# Altium footprint library 7-Connectors-7.PcbLib: 35 footprints (part 2 of 4)
Each footprint in its own frame and in the unit in brackets; x right, y up, seen from the top. Pads: shape width x height; smd on the part's side, far side on the other; paste and mask are expansions set on the pad; w line width, h text height; cw(c..) or ccw(c..) is an arc to the next point about the centre after c.
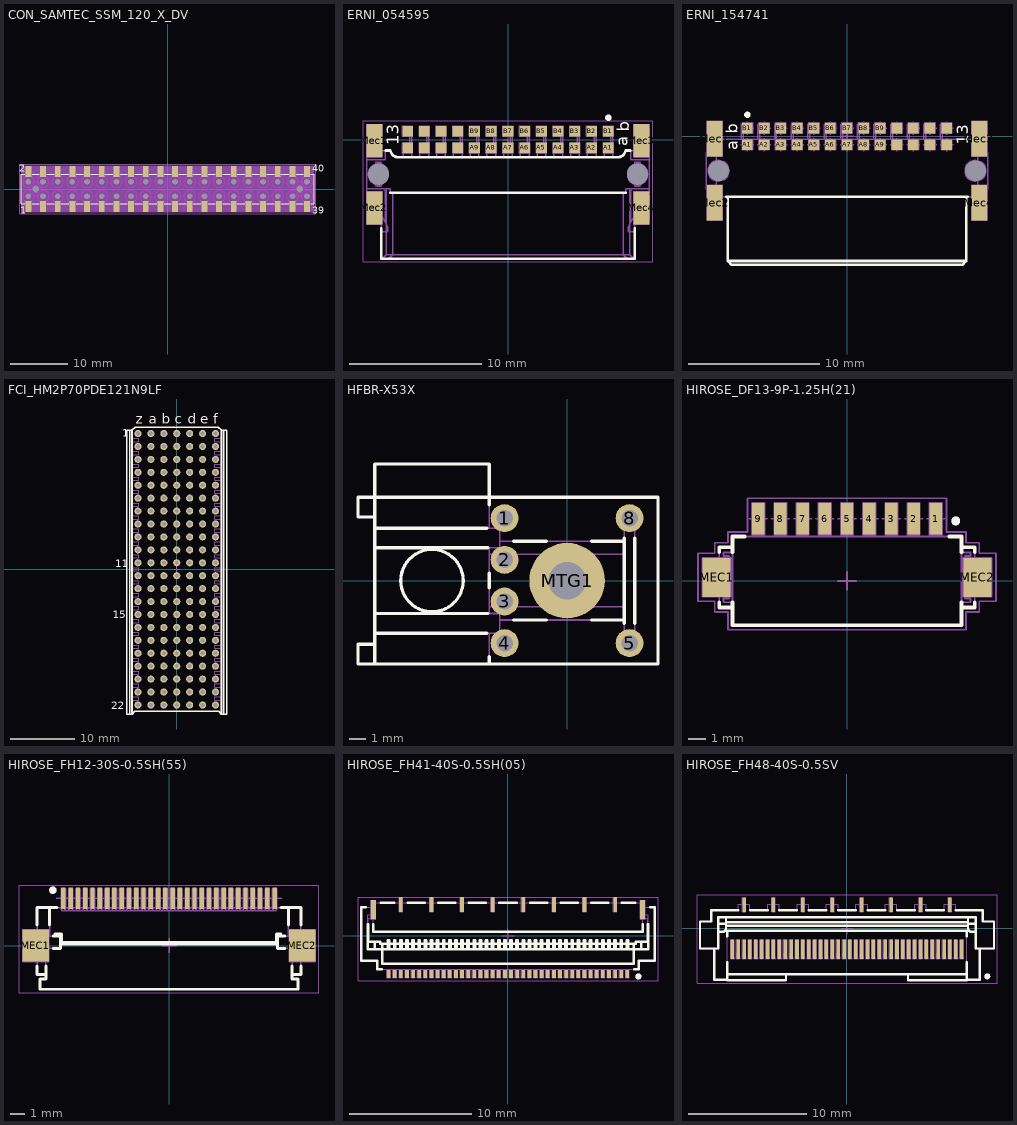
[diagram p1: the footprints below, top view; thin cyan lines are the x and y axes]

## CON_SAMTEC_SSM_120_X_DV [mm] "CON_SAMTEC_SSM_120_X_DV"
height 11
pads (82):
  rect 1.016x1.905 smd: 1(-24.13,-3.048) 2(-24.13,3.048) 3(-21.59,-3.048) 4(-21.59,3.048) 5(-19.05,-3.048) 6(-19.05,3.048) 7(-16.51,-3.048) 8(-16.51,3.048) 9(-13.97,-3.048) 10(-13.97,3.048) 11(-11.43,-3.048) 12(-11.43,3.048) 13(-8.89,-3.048) 14(-8.89,3.048) 15(-6.35,-3.048) 16(-6.35,3.048) 17(-3.81,-3.048) 18(-3.81,3.048) 19(-1.27,-3.048) 20(-1.27,3.048) 21(1.27,-3.048) 22(1.27,3.048) 23(3.81,-3.048) 24(3.81,3.048) 25(6.35,-3.048) 26(6.35,3.048) 27(8.89,-3.048) 28(8.89,3.048) 29(11.43,-3.048) 30(11.43,3.048) 31(13.97,-3.048) 32(13.97,3.048) 33(16.51,-3.048) 34(16.51,3.048) 35(19.05,-3.048) 36(19.05,3.048) 37(21.59,-3.048) 38(21.59,3.048) 39(24.13,-3.048) 40(24.13,3.048)
  round 0.5 / inner round 1 / far side round 0.5 hole 1: " "(-24.13,-1.27) " "(-24.13,1.27) " "(-21.59,-1.27) " "(-21.59,1.27) " "(-19.05,-1.27) " "(-19.05,1.27) " "(-16.51,-1.27) " "(-16.51,1.27) " "(-13.97,-1.27) " "(-13.97,1.27) " "(-11.43,-1.27) " "(-11.43,1.27) " "(-8.89,-1.27) " "(-8.89,1.27) " "(-6.35,-1.27) " "(-6.35,1.27) " "(-3.81,-1.27) " "(-3.81,1.27) " "(-1.27,-1.27) " "(-1.27,1.27) " "(1.27,-1.27) " "(1.27,1.27) " "(3.81,-1.27) " "(3.81,1.27) " "(6.35,-1.27) " "(6.35,1.27) " "(8.89,-1.27) " "(8.89,1.27) " "(11.43,-1.27) " "(11.43,1.27) " "(13.97,-1.27) " "(13.97,1.27) " "(16.51,-1.27) " "(16.51,1.27) " "(19.05,-1.27) " "(19.05,1.27) " "(21.59,-1.27) " "(21.59,1.27) " "(24.13,-1.27) " "(24.13,1.27)
  round 1 / inner round 1.19 / far side round 1 hole 1.19: " "(-22.86,0) " "(22.86,0)
Top Overlay:
  lines w0.18: -24.765,-2.54 -25.4,-2.54 -25.4,2.54 -24.765,2.54 ; -23.495,-2.54 -22.225,-2.54 -22.86,-2.54 ; -23.495,2.54 -22.225,2.54 ; -20.955,-2.54 -19.685,-2.54 ; -20.955,2.54 -19.685,2.54 ; -18.415,-2.54 -17.145,-2.54 ; -18.415,2.54 -17.145,2.54 ; -15.875,-2.54 -14.605,-2.54 ; -15.875,2.54 -14.605,2.54 ; -13.335,-2.54 -12.065,-2.54 ; -13.335,2.54 -12.065,2.54 ; -10.795,-2.54 -9.525,-2.54 ; -10.795,2.54 -9.525,2.54 ; -8.255,-2.54 -6.985,-2.54 ; -8.255,2.54 -6.985,2.54 ; -5.715,-2.54 -4.445,-2.54 ; -5.715,2.54 -4.445,2.54 ; -3.175,-2.54 -1.905,-2.54 ; -3.175,2.54 -1.905,2.54 ; -0.635,-2.54 0.635,-2.54 ; -0.635,2.54 0.635,2.54 ; 1.905,-2.54 3.175,-2.54 ; 1.905,2.54 3.175,2.54 ; 4.445,-2.54 5.715,-2.54 ; 4.445,2.54 5.715,2.54 ; 6.985,-2.54 8.255,-2.54 ; 6.985,2.54 8.255,2.54 ; 9.525,-2.54 10.795,-2.54 ; 9.525,2.54 10.795,2.54 ; 12.065,-2.54 13.335,-2.54 ; 12.065,2.54 13.335,2.54 ; 14.605,-2.54 15.875,-2.54 ; 14.605,2.54 15.875,2.54 ; 17.145,-2.54 18.415,-2.54 ; 17.145,2.54 18.415,2.54 ; 19.685,-2.54 20.955,-2.54 ; 19.685,2.54 20.955,2.54 ; 22.225,-2.54 23.495,-2.54 ; 22.225,2.54 23.495,2.54 ; 24.765,-2.54 25.4,-2.54 25.4,2.54 24.765,2.54
  text "39" at 25,-4.25 h1.2
  text "40" at 25,3 h1.2
  text "2" at -25.75,3 h1.2
  text "1" at -25.5,-4.25 h1.2
Mechanical 6:
  lines w0.18: -24.928,-2.54 -25.4,-2.54 -25.4,2.54 -24.928,2.54 ; -23.332,-2.54 -22.388,-2.54 -22.86,-2.54 ; -23.332,2.54 -22.388,2.54 ; -20.792,-2.54 -19.848,-2.54 ; -20.792,2.54 -19.848,2.54 ; -18.252,-2.54 -17.308,-2.54 ; -18.252,2.54 -17.308,2.54 ; -15.712,-2.54 -14.768,-2.54 ; -15.712,2.54 -14.768,2.54 ; -13.172,-2.54 -12.228,-2.54 ; -13.172,2.54 -12.228,2.54 ; -10.632,-2.54 -9.688,-2.54 ; -10.632,2.54 -9.688,2.54 ; -8.092,-2.54 -7.148,-2.54 ; -8.092,2.54 -7.148,2.54 ; -5.552,-2.54 -4.608,-2.54 ; -5.552,2.54 -4.608,2.54 ; -3.012,-2.54 -2.068,-2.54 ; -3.012,2.54 -2.068,2.54 ; -0.472,-2.54 0.472,-2.54 ; -0.472,2.54 0.472,2.54 ; 2.068,-2.54 3.012,-2.54 ; 2.068,2.54 3.012,2.54 ; 4.608,-2.54 5.552,-2.54 ; 4.608,2.54 5.552,2.54 ; 7.148,-2.54 8.092,-2.54 ; 7.148,2.54 8.092,2.54 ; 9.688,-2.54 10.632,-2.54 ; 9.688,2.54 10.632,2.54 ; 12.228,-2.54 13.172,-2.54 ; 12.228,2.54 13.172,2.54 ; 14.768,-2.54 15.712,-2.54 ; 14.768,2.54 15.712,2.54 ; 17.308,-2.54 18.252,-2.54 ; 17.308,2.54 18.252,2.54 ; 19.848,-2.54 20.792,-2.54 ; 19.848,2.54 20.792,2.54 ; 22.388,-2.54 23.332,-2.54 ; 22.388,2.54 23.332,2.54 ; 24.928,-2.54 25.4,-2.54 25.4,2.54 24.928,2.54
  text "1" at -25.5,-4.25 h1.2
  text "2" at -25.75,3 h1.2
  text "40" at 25,3 h1.2
  text "39" at 25,-4.25 h1.2
Mechanical 16:
  drawing of 219 lines, arcs and shapes, not listed
Multi-Layer keep-out:
  circle w0.025: c-21.59,-1.27 r1.016
  circle w0.025: c-24.13,-1.27 r1.016
  circle w0.025: c-24.13,1.27 r1.016
  circle w0.025: c-21.59,1.27 r1.016
  circle w0.025: c-16.51,-1.27 r1.016
  circle w0.025: c-19.05,-1.27 r1.016
  circle w0.025: c-19.05,1.27 r1.016
  circle w0.025: c-16.51,1.27 r1.016
  circle w0.025: c-13.97,1.27 r1.016
  circle w0.025: c-13.97,-1.27 r1.016
  circle w0.025: c-11.43,-1.27 r1.016
  circle w0.025: c-11.43,1.27 r1.016
  circle w0.025: c-8.89,1.27 r1.016
  circle w0.025: c-6.35,1.27 r1.016
  circle w0.025: c-6.35,-1.27 r1.016
  circle w0.025: c-3.81,-1.27 r1.016
  circle w0.025: c-3.81,1.27 r1.016
  circle w0.025: c3.81,-1.27 r1.016
  circle w0.025: c1.27,-1.27 r1.016
  circle w0.025: c-1.27,-1.27 r1.016
  circle w0.025: c-1.27,1.27 r1.016
  circle w0.025: c1.27,1.27 r1.016
  circle w0.025: c3.81,1.27 r1.016
  circle w0.025: c6.35,1.27 r1.016
  circle w0.025: c6.35,-1.27 r1.016
  circle w0.025: c8.89,-1.27 r1.016
  circle w0.025: c8.89,1.27 r1.016
  circle w0.025: c11.43,1.27 r1.016
  circle w0.025: c11.43,-1.27 r1.016
  circle w0.025: c13.97,-1.27 r1.016
  circle w0.025: c13.97,1.27 r1.016
  circle w0.025: c16.51,1.27 r1.016
  circle w0.025: c16.51,-1.27 r1.016
  circle w0.025: c19.05,-1.27 r1.016
  circle w0.025: c19.05,1.27 r1.016
  circle w0.025: c21.59,1.27 r1.016
  circle w0.025: c21.59,-1.27 r1.016
  circle w0.025: c24.13,-1.27 r1.016
  circle w0.025: c24.13,1.27 r1.016
  circle w0.025: c22.86,0 r1.19
  circle w0.025: c-22.86,0 r1.19
Mechanical 18:
  text "26" at 5.95,3.048 h0.5
  text "25" at 5.95,-3.048 h0.5
  text "27" at 8.49,-3.048 h0.5
  text "30" at 11.03,3.048 h0.5
  text "39" at 23.73,-3.048 h0.5
  text "28" at 8.49,3.048 h0.5
  text "29" at 11.03,-3.048 h0.5
  text "37" at 21.19,-3.048 h0.5
  text "38" at 21.19,3.048 h0.5
  text "31" at 13.57,-3.048 h0.5
  text "32" at 13.57,3.048 h0.5
  text "34" at 16.11,3.048 h0.5
  text "33" at 16.11,-3.048 h0.5
  text "23" at 3.41,-3.048 h0.5
  text "11" at -11.83,-3.048 h0.5
  text "16" at -6.75,3.048 h0.5
  text "24" at 3.41,3.048 h0.5
  text "22" at 0.87,3.048 h0.5
  text "18" at -4.21,3.048 h0.5
  text "13" at -9.29,-3.048 h0.5
  text "17" at -4.21,-3.048 h0.5
  text "21" at 0.87,-3.048 h0.5
  text "15" at -6.75,-3.048 h0.5
  text "20" at -1.67,3.048 h0.5
  text "14" at -9.29,3.048 h0.5
  text "19" at -1.67,-3.048 h0.5
  text "12" at -11.83,3.048 h0.5
  text "10" at -14.37,3.048 h0.5
  text "9" at -14.17,-3.048 h0.5
  text "8" at -16.71,3.048 h0.5
  text "7" at -16.71,-3.048 h0.5
  text "2" at -24.33,3.048 h0.5
  text "4" at -21.79,3.048 h0.5
  text "6" at -19.25,3.048 h0.5
  text "5" at -19.25,-3.048 h0.5
  text "1" at -24.33,-3.048 h0.5
  text "3" at -21.79,-3.048 h0.5
  text "36" at 18.65,3.048 h0.5
  text "35" at 18.65,-3.048 h0.5
  text "40" at 23.73,3.048 h0.5
Mechanical 20:
  text "40" at 22.86,0.635 h1.12
  text "2" at -24.765,0.635 h1.12
  text "39" at 22.86,-1.905 h1.12
  text "1" at -24.765,-1.905 h1.12
  text "PARTNUM" at -5.04,-0.953 h1.8
  text "TOLERANCE" at -6.48,-0.953 h1.8
  text "HDR_2x20_SMT" at -8.64,-0.953 h1.8
Mechanical 24:
  text "PERC: 1mm19 +0.08 -0.00" at -9,-8.04 h0.5
  text "DOC : SAMTEC" at -9,-9.54 h0.5
  text "HGT : 7.40mm" at -9,-8.79 h0.5
  text "PAD : 1mm016x1mm905 tnm1mm19_01 tnm1mm0" at -9,-7.29 h0.5
  text "NAME: CON_SAMTEC_SSM_120_X_DV" at -9,-6.54 h0.5
3D body "p190-100.stp": height 0.02, standoff 0, extent -24.63,-3.998 -23.63,-2.098
3D body "p190-100.stp": height 0.02, standoff 0, extent -24.63,2.098 -23.63,3.998
3D body "p190-100.stp": height 0.02, standoff 0, extent -22.09,-3.998 -21.09,-2.098
3D body "p190-100.stp": height 0.02, standoff 0, extent -22.09,2.098 -21.09,3.998
3D body "p190-100.stp": height 0.02, standoff 0, extent -19.55,-3.998 -18.55,-2.098
3D body "p190-100.stp": height 0.02, standoff 0, extent -19.55,2.098 -18.55,3.998
3D body "p190-100.stp": height 0.02, standoff 0, extent -17.01,-3.998 -16.01,-2.098
3D body "p190-100.stp": height 0.02, standoff 0, extent -17.01,2.098 -16.01,3.998
3D body "p190-100.stp": height 0.02, standoff 0, extent -14.47,-3.998 -13.47,-2.098
3D body "p190-100.stp": height 0.02, standoff 0, extent -14.47,2.098 -13.47,3.998
3D body "p190-100.stp": height 0.02, standoff 0, extent -11.93,-3.998 -10.93,-2.098
3D body "p190-100.stp": height 0.02, standoff 0, extent -11.93,2.098 -10.93,3.998
3D body "p190-100.stp": height 0.02, standoff 0, extent -9.39,-3.998 -8.39,-2.098
3D body "p190-100.stp": height 0.02, standoff 0, extent -9.39,2.098 -8.39,3.998
3D body "p190-100.stp": height 0.02, standoff 0, extent -6.85,-3.998 -5.85,-2.098
3D body "p190-100.stp": height 0.02, standoff 0, extent -6.85,2.098 -5.85,3.998
3D body "p190-100.stp": height 0.02, standoff 0, extent -4.31,-3.998 -3.31,-2.098
3D body "p190-100.stp": height 0.02, standoff 0, extent -4.31,2.098 -3.31,3.998
3D body "p190-100.stp": height 0.02, standoff 0, extent -1.77,-3.998 -0.77,-2.098
3D body "p190-100.stp": height 0.02, standoff 0, extent -1.77,2.098 -0.77,3.998
3D body "p190-100.stp": height 0.02, standoff 0, extent 0.77,-3.998 1.77,-2.098
3D body "p190-100.stp": height 0.02, standoff 0, extent 0.77,2.098 1.77,3.998
3D body "p190-100.stp": height 0.02, standoff 0, extent 3.31,-3.998 4.31,-2.098
3D body "p190-100.stp": height 0.02, standoff 0, extent 3.31,2.098 4.31,3.998
3D body "p190-100.stp": height 0.02, standoff 0, extent 5.85,-3.998 6.85,-2.098
3D body "p190-100.stp": height 0.02, standoff 0, extent 5.85,2.098 6.85,3.998
3D body "p190-100.stp": height 0.02, standoff 0, extent 8.39,-3.998 9.39,-2.098
3D body "p190-100.stp": height 0.02, standoff 0, extent 8.39,2.098 9.39,3.998
3D body "p190-100.stp": height 0.02, standoff 0, extent 10.93,2.098 11.93,3.998
3D body "p190-100.stp": height 0.02, standoff 0, extent 10.93,-3.998 11.93,-2.098
3D body "p190-100.stp": height 0.02, standoff 0, extent 13.47,-3.998 14.47,-2.098
3D body "p190-100.stp": height 0.02, standoff 0, extent 13.47,2.098 14.47,3.998
3D body "p190-100.stp": height 0.02, standoff 0, extent 16.01,-3.998 17.01,-2.098
3D body "p190-100.stp": height 0.02, standoff 0, extent 16.01,2.098 17.01,3.998
3D body "p190-100.stp": height 0.02, standoff 0, extent 18.55,2.098 19.55,3.998
3D body "p190-100.stp": height 0.02, standoff 0, extent 18.55,-3.998 19.55,-2.098
3D body "p190-100.stp": height 0.02, standoff 0, extent 21.09,-3.998 22.09,-2.098
3D body "p190-100.stp": height 0.02, standoff 0, extent 18.55,2.098 19.55,3.998
3D body "p190-100.stp": height 0.02, standoff 0, extent 21.09,2.098 22.09,3.998
3D body "p190-100.stp": height 0.02, standoff 0, extent 23.63,2.098 24.63,3.998
3D body "p190-100.stp": height 0.02, standoff 0, extent 23.63,-3.998 24.63,-2.098

## ERNI_054595 [mil] "26 Contacts Pitch 1.27  SMC Right Angle Male Connector Type B"
height 165.35
pads (32):
  rect 31.5x31.5 smd: A1(300,-25) A2(250,-25) A3(200,-25) A4(150,-25) A5(100,-25) A6(50,-25) A7(0,-25) A8(-50,-25) A9(-100,-25) A10(-150,-25) A11(-200,-25) A12(-250,-25) A13(-300,-25) B1(300,25) B2(250,25) B3(200,25) B4(150,25) B5(100,25) B6(50,25) B7(0,25) B8(-50,25) B9(-100,25) B10(-150,25) B11(-200,25) B12(-250,25) B13(-300,25)
  rect 47.24x98.43 smd: Mec1(-398.82,-3.35) Mec2(-398.82,-204.13) Mec3(398.82,-3.35) Mec4(398.82,-204.13)
  round 39.37 hole 62.99 unplated mask+15.75: Mec5(-387.01,-103.74) Mec6(387.01,-103.74)
Top Overlay:
  circle w9.84: c300,65 r4.92
  lines w7.87: -378.78,-265 -378.78,-355.73 378.78,-355.73 378.78,-265 ; -365,-32.87 -351.22,-32.87 -348.77,-39.6 ccw(c-330.27,-32.87) -330.27,-52.55 330.27,-52.55 ccw(c330.27,-32.87) 348.77,-39.6 351.22,-32.87 365,-32.87 ; -351.61,-158.86 351.61,-158.86
  text "13" at -326.77,-16.73 h35.43
  text "b" at 362.2,22.64 h35.43
  text "a" at 358.27,-20.67 h35.43
Mechanical 8:
  drawing of 188 lines, arcs and shapes, not listed
Mechanical 14:
  drawing of 326 lines, arcs and shapes, not listed
  text "a13" at -330.71,-110.24 h39.37
  text "a1" at 290.55,-110.24 h39.37
  text "13" at -326.77,-16.73 h35.43
  text "a" at 358.27,-20.67 h35.43
  text "b" at 362.2,22.64 h35.43
Mechanical 15:
  lines w1.97: -432.33,-365.58 432.33,-365.58 432.33,55.71 -432.33,55.71 -432.33,-365.58
3D body "p080-080.stp": height 0.79, standoff 0, extent 284.26,9.26 315.76,40.75
3D body "p080-080.stp": height 0.79, standoff 0, extent 284.26,-40.74 315.76,-9.25
3D body "p080-080.stp": height 0.79, standoff 0, extent 234.26,-40.74 265.76,-9.25
3D body "p080-080.stp": height 0.79, standoff 0, extent 234.26,9.26 265.76,40.75
3D body "p080-080.stp": height 0.79, standoff 0, extent 184.26,9.26 215.76,40.75
3D body "p080-080.stp": height 0.79, standoff 0, extent 184.26,-40.74 215.76,-9.25
3D body "p080-080.stp": height 0.79, standoff 0, extent 134.26,-40.74 165.76,-9.25
3D body "p080-080.stp": height 0.79, standoff 0, extent 134.26,9.26 165.76,40.75
3D body "p080-080.stp": height 0.79, standoff 0, extent 84.26,9.26 115.76,40.75
3D body "p080-080.stp": height 0.79, standoff 0, extent 84.26,-40.74 115.76,-9.25
3D body "p080-080.stp": height 0.79, standoff 0, extent 34.26,-40.74 65.76,-9.25
3D body "p080-080.stp": height 0.79, standoff 0, extent 34.26,9.26 65.76,40.75
3D body "p080-080.stp": height 0.79, standoff 0, extent -15.74,9.26 15.76,40.75
3D body "p080-080.stp": height 0.79, standoff 0, extent -15.74,-40.74 15.76,-9.25
3D body "p080-080.stp": height 0.79, standoff 0, extent -65.74,9.26 -34.24,40.75
3D body "p080-080.stp": height 0.79, standoff 0, extent -65.74,-40.74 -34.24,-9.25
3D body "p080-080.stp": height 0.79, standoff 0, extent -115.74,-40.74 -84.24,-9.25
3D body "p080-080.stp": height 0.79, standoff 0, extent -115.74,9.26 -84.24,40.75
3D body "p080-080.stp": height 0.79, standoff 0, extent -165.74,9.26 -134.24,40.75
3D body "p080-080.stp": height 0.79, standoff 0, extent -165.74,-40.74 -134.24,-9.25
3D body "p080-080.stp": height 0.79, standoff 0, extent -215.74,-40.74 -184.24,-9.25
3D body "p080-080.stp": height 0.79, standoff 0, extent -215.74,9.26 -184.24,40.75
3D body "p080-080.stp": height 0.79, standoff 0, extent -265.74,9.26 -234.24,40.75
3D body "p080-080.stp": height 0.79, standoff 0, extent -265.74,-40.74 -234.24,-9.25
3D body "p080-080.stp": height 0.79, standoff 0, extent -315.74,-40.74 -284.24,-9.25
3D body "p080-080.stp": height 0.79, standoff 0, extent -315.74,9.26 -284.24,40.75
3D body "p250-120.stp": height 0.79, standoff 0, extent 375.2,-253.34 422.45,-154.91
3D body "p250-120.stp": height 0.79, standoff 0, extent 375.2,-52.55 422.45,45.87
3D body "p250-120.stp": height 0.79, standoff 0, extent -422.44,-52.55 -375.19,45.87
3D body "p250-120.stp": height 0.79, standoff 0, extent -422.44,-253.34 -375.19,-154.91

## ERNI_154741 [mil] "SMC, 26 Contacts Pitch 1.27, Dual Row Right Angle Female Connectors: Type Q"
height 151.57
pads (32):
  rect 31.5x31.5 smd: A1(-300,-25) A2(-250,-25) A3(-200,-25) A4(-150,-25) A5(-100,-25) A6(-50,-25) A7(0,-25) A8(50,-25) A9(100,-25) A10(150,-25) A11(200,-25) A12(250,-25) A13(300,-25) B1(-300,25) B2(-250,25) B3(-200,25) B4(-150,25) B5(-100,25) B6(-50,25) B7(0,25) B8(50,25) B9(100,25) B10(150,25) B11(200,25) B12(250,25) B13(300,25)
  rect 47.24x106.3 smd: Mec1(-398.82,-7.28) Mec2(-398.82,-200.2) Mec3(398.82,-7.28) Mec4(398.82,-200.2)
  round 39.37 hole 62.99 unplated mask+15.75: Mec5(-387.01,-103.74) Mec6(387.01,-103.74)
Top Overlay:
  circle w9.84: c-300,65 r4.92
  lines w7.87: -363.39,-182.5 363.39,-182.5 ; -359.17,-182.5 -359.17,-375.46 ; 359.17,-182.5 359.17,-375.46 ; -359.17,-375.46 359.17,-375.46 ; -359.17,-375.46 -347.34,-387.2 347.34,-387.2 359.17,-375.46
  text "13" at 365.16,-25.59 h35.43
  text "b" at -328.54,8.27 h35.43
  text "a" at -328.54,-41.73 h35.43
Mechanical 8:
  drawing of 252 lines, arcs and shapes, not listed
Mechanical 14:
  lines w3.94: -420.2,-160.24 -420.2,-245.51 -378.88,-245.51 -378.88,-182.5 378.88,-182.5 378.88,-245.51 420.2,-245.51 420.2,-160.24 ; -420.2,-47.3 -420.2,37.97 -378.88,37.97 -378.88,-21.18 -394.57,-21.18 -394.57,-186.53 -378.88,-186.53 ; -394.57,-166.82 -408.87,-166.82 -424.66,-157.65 -424.66,-49.89 -409.02,-40.81 -394.57,-40.81 ; -378.88,-9.35 378.88,-9.35 ; -359.17,-182.5 -359.17,-375.46 ; -318.28,-9.35 -318.28,36.77 -289.99,36.77 -289.99,13.2 -312.45,13.2 -312.45,-9.35 ; -268.39,-9.35 -268.39,36.77 -240.02,36.77 -240.02,13.2 -262.48,13.2 -262.48,-9.35 ; -218.42,-9.35 -218.42,36.77 -190.13,36.77 -190.13,13.2 -212.5,13.2 -212.5,-9.35 ; -168.44,-9.35 -168.44,36.77 -140.15,36.77 -140.15,13.2 -162.53,13.2 -162.53,-9.35 ; -118.47,-9.35 -118.47,36.77 -90.18,36.77 -90.18,13.2 -112.55,13.2 -112.55,-9.35 ; -68.58,-9.35 -68.58,36.77 -40.2,36.77 -40.2,13.2 -62.66,13.2 -62.66,-9.35 ; -18.52,-9.35 -18.52,36.77 9.77,36.77 9.77,13.2 -12.6,13.2 -12.6,-9.35 ; 31.37,-9.35 31.37,36.77 59.75,36.77 59.75,13.2 37.29,13.2 37.29,-9.35 ; 81.35,-9.35 81.35,36.77 109.72,36.77 109.72,13.2 87.26,13.2 87.26,-9.35 ; 131.32,-9.35 131.32,36.77 159.61,36.77 159.61,13.2 137.24,13.2 137.24,-9.35 ; 181.3,-9.35 181.3,36.77 209.59,36.77 209.59,13.2 187.21,13.2 187.21,-9.35 ; 231.27,-9.35 231.27,36.77 259.56,36.77 259.56,13.2 237.1,13.2 237.1,-9.35 ; 281.25,-9.35 281.25,36.77 309.54,36.77 309.54,13.2 287.16,13.2 287.16,-9.35 ; 359.17,-182.5 359.17,-375.46 ; 378.88,-186.53 394.57,-186.53 394.57,-21.18 378.88,-21.18 ; 392.69,-21.18 378.88,-21.18 ; 394.57,-166.82 408.87,-166.82 424.66,-157.65 424.66,-49.89 409.02,-40.81 394.57,-40.81 ; 420.2,-47.3 420.2,37.97 378.88,37.97 378.88,-21.18 ; -359.17,-375.46 359.17,-375.46 ; -359.17,-375.46 -347.34,-387.2 347.34,-387.2 359.17,-375.46
  text "a1" at -319.37,-98.19 h35.43
  text "a13" at 246.06,-98.66 h39.37
  text "a" at -328.54,-41.73 h35.43
  text "b" at -328.54,8.27 h35.43
3D body "ERNI_154741.stp": height 151.57, standoff -29.53, extent -425,-387.2 425,38
3D body "p080-080.stp": height 0.79, standoff 0, extent -315.75,9.25 -284.25,40.75
3D body "p080-080.stp": height 0.79, standoff 0, extent -315.75,-40.75 -284.25,-9.25
3D body "p080-080.stp": height 0.79, standoff 0, extent -265.75,9.25 -234.25,40.75
3D body "p080-080.stp": height 0.79, standoff 0, extent -265.75,-40.75 -234.25,-9.25
3D body "p080-080.stp": height 0.79, standoff 0, extent -215.75,9.25 -184.25,40.75
3D body "p080-080.stp": height 0.79, standoff 0, extent -215.75,-40.75 -184.25,-9.25
3D body "p080-080.stp": height 0.79, standoff 0, extent -165.75,9.25 -134.25,40.75
3D body "p080-080.stp": height 0.79, standoff 0, extent -165.75,-40.75 -134.25,-9.25
3D body "p080-080.stp": height 0.79, standoff 0, extent -115.75,9.25 -84.25,40.75
3D body "p080-080.stp": height 0.79, standoff 0, extent -115.75,-40.75 -84.25,-9.25
3D body "p080-080.stp": height 0.79, standoff 0, extent -65.75,9.25 -34.25,40.75
3D body "p080-080.stp": height 0.79, standoff 0, extent -65.75,-40.75 -34.25,-9.25
3D body "p080-080.stp": height 0.79, standoff 0, extent -15.75,9.25 15.75,40.75
3D body "p080-080.stp": height 0.79, standoff 0, extent -15.75,-40.75 15.75,-9.25
3D body "p080-080.stp": height 0.79, standoff 0, extent 34.25,9.25 65.75,40.75
3D body "p080-080.stp": height 0.79, standoff 0, extent 34.25,-40.75 65.75,-9.25
3D body "p080-080.stp": height 0.79, standoff 0, extent 84.25,9.25 115.75,40.75
3D body "p080-080.stp": height 0.79, standoff 0, extent 84.25,-40.75 115.75,-9.25
3D body "p080-080.stp": height 0.79, standoff 0, extent 134.25,-40.75 165.75,-9.25
3D body "p080-080.stp": height 0.79, standoff 0, extent 134.25,9.25 165.75,40.75
3D body "p080-080.stp": height 0.79, standoff 0, extent 184.25,9.25 215.75,40.75
3D body "p080-080.stp": height 0.79, standoff 0, extent 184.25,-40.75 215.75,-9.25
3D body "p080-080.stp": height 0.79, standoff 0, extent 234.25,9.25 265.75,40.75
3D body "p080-080.stp": height 0.79, standoff 0, extent 234.25,-40.75 265.75,-9.25
3D body "p080-080.stp": height 0.79, standoff 0, extent 284.25,9.25 315.75,40.75
3D body "p080-080.stp": height 0.79, standoff 0, extent 284.25,-40.75 315.75,-9.25
3D body "p300-140.stp": height 0.79, standoff 0, extent -427.56,-64.06 -372.44,54.05
3D body "p300-140.stp": height 0.79, standoff 0, extent -427.56,-264.06 -372.44,-145.95
3D body "p300-140.stp": height 0.79, standoff 0, extent 372.44,-69.06 427.56,49.05
3D body "p300-140.stp": height 0.79, standoff 0, extent 372.44,-264.06 427.56,-145.95

## FCI_HM2P70PDE121N9LF [mm] "110+44 Contacts, 22 positions x 5 Rows  (a,b,c,d,e) + 2  Rows (z,f), Pitch 2 mm,  Press-Fit, Straight Hard Metric Male Connector, Millipacs, Type B22"
height 13.6
pads (154):
  round 1.1 hole 0.6: a1(-4,21) a2(-4,19) a3(-4,17) a4(-4,15) a5(-4,13) a6(-4,11) a7(-4,9) a8(-4,7) a9(-4,5) a10(-4,3) a11(-4,1) a12(-4,-1) a13(-4,-3) a14(-4,-5) a15(-4,-7) a16(-4,-9) a17(-4,-11) a18(-4,-13) a19(-4,-15) a20(-4,-17) a21(-4,-19) a22(-4,-21) b1(-2,21) b2(-2,19) b3(-2,17) b4(-2,15) b5(-2,13) b6(-2,11) b7(-2,9) b8(-2,7) b9(-2,5) b10(-2,3) b11(-2,1) b12(-2,-1) b13(-2,-3) b14(-2,-5) b15(-2,-7) b16(-2,-9) b17(-2,-11) b18(-2,-13) b19(-2,-15) b20(-2,-17) b21(-2,-19) b22(-2,-21) c1(0,21) c2(0,19) c3(0,17) c4(0,15) c5(0,13) c6(0,11) c7(0,9) c8(0,7) c9(0,5) c10(0,3) c11(0,1) c12(0,-1) c13(0,-3) c14(0,-5) c15(0,-7) c16(0,-9) c17(0,-11) c18(0,-13) c19(0,-15) c20(0,-17) c21(0,-19) c22(0,-21) d1(2,21) d2(2,19) d3(2,17) d4(2,15) d5(2,13) d6(2,11) d7(2,9) d8(2,7) d9(2,5) d10(2,3) d11(2,1) d12(2,-1) d13(2,-3) d14(2,-5) d15(2,-7) d16(2,-9) d17(2,-11) d18(2,-13) d19(2,-15) d20(2,-17) d21(2,-19) d22(2,-21) e1(4,21) e2(4,19) e3(4,17) e4(4,15) e5(4,13) e6(4,11) e7(4,9) e8(4,7) e9(4,5) e10(4,3) e11(4,1) e12(4,-1) e13(4,-3) e14(4,-5) e15(4,-7) e16(4,-9) e17(4,-11) e18(4,-13) e19(4,-15) e20(4,-17) e21(4,-19) e22(4,-21) f1(6,21) f2(6,19) f3(6,17) f4(6,15) f5(6,13) f6(6,11) f7(6,9) f8(6,7) f9(6,5) f10(6,3) f11(6,1) f12(6,-0.998) f13(6,-3) f14(6,-4.998) f15(6,-7) f16(6,-9) f17(6,-11) f18(6,-13) f19(6,-15) f20(6,-17) f21(6,-19) f22(6,-21) z1(-6,21) z2(-6,19) z3(-6,17) z4(-6,15) z5(-6,13) z6(-6,11) z7(-6,9) z8(-6,7) z9(-6,5) z10(-6,3) z11(-6,1) z12(-6,-1) z13(-6,-3) z14(-6,-5) z15(-6,-7) z16(-6,-9) z17(-6,-11) z18(-6,-13) z19(-6,-15) z20(-6,-17) z21(-6,-19) z22(-6,-21)
Top Overlay:
  lines w0.2: -7.25,-22.4 -7.25,21.5 ; -6.95,-22.4 -6.95,21.5 ; -6.9,21.55 -6.9,-22.4 ; 6.9,21.55 6.9,-22.4 ; 6.95,-22.4 6.95,21.5 ; 7.25,-22.4 7.25,21.5 ; -6.95,21.5 -7.7,21.5 -7.7,-22.4 -6.9,-22.4 ; -6.95,21.5 -6.45,22 6.45,22 6.95,21.5 ; -6.9,-22.4 -6.5,-22 6.5,-22 6.9,-22.4 ; 6.9,-22.4 7.7,-22.4 7.7,21.5 6.95,21.5
  text "15" at -9.925,-7.558 h1.2
  text "22" at -10.1,-21.661 h1.2
  text "1" at -8.45,20.475 h1.2
  text "11" at -9.525,0.342 h1.2
  text "z" at -6.363,22.525 h1.5
  text "f" at 5.637,22.5 h1.5
  text "e" at 3.667,22.517 h1.5
  text "d" at 1.667,22.5 h1.5
  text "c" at -0.333,22.517 h1.5
  text "b" at -2.333,22.5 h1.5
  text "a" at -4.333,22.517 h1.5
Mechanical 8:
  drawing of 620 lines, arcs and shapes, not listed
Mechanical 14:
  drawing of 760 lines, arcs and shapes, not listed
  text "15" at -9.925,-7.558 h1.2
  text "22" at -10.1,-21.661 h1.2
  text "11" at -9.525,0.342 h1.2
  text "1" at -8.45,20.475 h1.2
  text "z" at -6.363,22.525 h1.5
  text "f" at 5.637,22.5 h1.5
  text "e" at 3.667,22.517 h1.5
  text "d" at 1.667,22.5 h1.5
  text "c" at -0.333,22.517 h1.5
  text "b" at -2.333,22.5 h1.5
  text "a" at -4.333,22.517 h1.5
Drill Drawing:
  lines w0.1: -6.9,-18.7 -6.9,-22 6.9,-22 6.9,22 -6.9,22 -6.9,19.7
  text "PRESS-FIT TECHNOLOGY diam. 0.6mm +0.05 -0" at -7.2,-17.775 h1
3D body "FCI_HM2P70PDE121N9LF.stp": height 13.45, standoff -3.3, extent -7.7,-22.4 7.7,22

## HFBR-X53X [mm] "HFBR-0500Z Series, Vertical Package Fiber Optic Transmitter or Receiver, Through Hole Mount"
height 18.8
pads (7):
  round 1.7 hole 1: 1(-3.81,3.81) 2(-3.81,1.27) 3(-3.81,-1.27) 4(-3.81,-3.81) 5(3.81,-3.81) 8(3.81,3.81)
  round 4.6 hole 2.3: MTG1(0,0)
Top Overlay:
  circle w0.2: c-8.24,0 r1.9
  lines w0.2: -11.73,-3.88 -12.75,-3.88 -12.75,-5.08 -11.73,-5.08 ; -11.73,-3.2 -4.901,-3.2 ; -11.73,-2 -4.825,-2 ; -11.73,2 -4.825,2 ; -11.73,3.2 -4.901,3.2 ; -11.73,3.88 -12.75,3.88 -12.75,5.08 5.54,5.08 5.54,-5.08 -11.73,-5.08 ; -4.75,-5.08 -4.75,-4.634 ; -4.75,-0.446 -4.75,0.446 ; -4.75,4.634 -4.75,7.11 -11.73,7.11 -11.73,-5.08 ; -3.276,-2.4 -1.27,-2.4 ; -3.276,2.4 -1.27,2.4 ; 1.484,-2.4 3.49,-2.4 ; 1.484,2.4 3.49,2.4 ; 3.49,-2.602 3.49,2.602 ; 4.13,-2.602 4.13,2.602
Mechanical 8:
  lines w0.1: -4.31,-3.81 -3.81,-3.81 ; -4.31,-1.27 -3.81,-1.27 ; -4.31,1.27 -3.81,1.27 ; -4.31,3.81 -3.81,3.81 ; -3.81,-4.31 -3.81,-3.81 ; -3.81,-3.31 -3.81,-3.81 ; -3.81,-1.77 -3.81,-1.27 ; -3.81,-0.77 -3.81,-1.27 ; -3.81,0.77 -3.81,1.27 ; -3.81,1.77 -3.81,1.27 ; -3.81,3.31 -3.81,3.81 ; -3.81,4.31 -3.81,3.81 ; -3.31,-3.81 -3.81,-3.81 ; -3.31,-1.27 -3.81,-1.27 ; -3.31,1.27 -3.81,1.27 ; -3.31,3.81 -3.81,3.81 ; -0.5,0 0,0 ; 0,-0.5 0,0 ; 0,0.5 0,0 ; 0.5,0 0,0 ; 3.31,-3.81 3.81,-3.81 ; 3.31,3.81 3.81,3.81 ; 3.81,-4.31 3.81,-3.81 ; 3.81,-3.31 3.81,-3.81 ; 3.81,3.31 3.81,3.81 ; 3.81,4.31 3.81,3.81 ; 4.31,-3.81 3.81,-3.81 ; 4.31,3.81 3.81,3.81
Mechanical 14:
  circle w0.1: c-8.24,0 r1.9
  lines w0.1: -11.73,-3.88 -12.75,-3.88 -12.75,-5.08 -11.73,-5.08 ; -11.73,-3.2 -4.11,-3.2 -4.11,-2 -11.73,-2 ; -11.73,2 -4.11,2 -4.11,3.2 -11.73,3.2 ; -11.73,3.88 -12.75,3.88 -12.75,5.08 5.54,5.08 5.54,-5.08 -11.73,-5.08 ; -4.75,-5.08 -4.75,-3.2 ; -4.75,-2 -4.75,2 ; -4.75,-1.6 3.49,-1.6 ; -4.75,1.6 3.49,1.6 ; -4.75,3.2 -4.75,7.11 -11.73,7.11 -11.73,-5.08 ; -4.11,-2.4 3.49,-2.4 ; -4.11,2.4 3.49,2.4 ; 3.11,3.81 cw(c3.81,3.81) 4.51,3.81 ; 3.49,-3.81 ccw(c3.81,-3.81) 4.13,-3.81 4.13,3.81 ccw(c3.81,3.81) 3.49,3.81 3.49,-3.81
3D body "HFBR-x53x.stp": height 18.8, standoff -4, extent -12.75,-5.08 5.54,7.11

## HIROSE_DF13-9P-1.25H(21) [mm] "Pitch 1.25mm, Single Row, 9 Contacts, Right Angle SMT Header, Series DF13"
height 3.6
pads (11):
  rect 0.7x1.8 smd: 1(5,3.5) 2(3.75,3.5) 3(2.5,3.5) 4(1.25,3.5) 5(0,3.5) 6(-1.25,3.5) 7(-2.5,3.5) 8(-3.75,3.5) 9(-5,3.5)
  rect 1.6x2.2 smd: MEC1(-7.35,0.2) MEC2(7.35,0.2)
Top Overlay:
  circle w0.25: c6.125,3.376 r0.125
  lines w0.2: -7.2,-1.2 -7.2,-1.5 -6.45,-1.5 ; -7.2,1.6 -7.2,1.9 -6.45,1.9 ; -6.45,-1.2 -6.45,-2.5 6.45,-2.5 6.45,-1.2 ; -6.45,1.6 -6.45,2.5 -5.75,2.5 ; 5.75,2.5 6.45,2.5 6.45,1.6 ; 6.45,-1.5 7.2,-1.5 7.2,-1.2 ; 6.45,1.9 7.2,1.9 7.2,1.6
Mechanical 8:
  lines w0.1: -7.85,0.2 -7.35,0.2 ; -7.35,-0.3 -7.35,0.2 ; -7.35,0.7 -7.35,0.2 ; -6.85,0.2 -7.35,0.2 ; -5.5,3.5 -5,3.5 ; -5,3 -5,3.5 ; -5,4 -5,3.5 ; -4.5,3.5 -5,3.5 ; -4.25,3.5 -3.75,3.5 ; -3.75,3 -3.75,3.5 ; -3.75,4 -3.75,3.5 ; -3.25,3.5 -3.75,3.5 ; -3,3.5 -2.5,3.5 ; -2.5,3 -2.5,3.5 ; -2.5,4 -2.5,3.5 ; -2,3.5 -2.5,3.5 ; -1.75,3.5 -1.25,3.5 ; -1.25,3 -1.25,3.5 ; -1.25,4 -1.25,3.5 ; -0.75,3.5 -1.25,3.5 ; -0.5,0 0,0 ; -0.5,3.5 0,3.5 ; 0,-0.5 0,0 ; 0,0.5 0,0 ; 0,3 0,3.5 ; 0,4 0,3.5 ; 0.5,0 0,0 ; 0.5,3.5 0,3.5 ; 0.75,3.5 1.25,3.5 ; 1.25,3 1.25,3.5 ; 1.25,4 1.25,3.5 ; 1.75,3.5 1.25,3.5 ; 2,3.5 2.5,3.5 ; 2.5,3 2.5,3.5 ; 2.5,4 2.5,3.5 ; 3,3.5 2.5,3.5 ; 3.25,3.5 3.75,3.5 ; 3.75,3 3.75,3.5 ; 3.75,4 3.75,3.5 ; 4.25,3.5 3.75,3.5 ; 4.5,3.5 5,3.5 ; 5,3 5,3.5 ; 5,4 5,3.5 ; 5.5,3.5 5,3.5 ; 6.85,0.2 7.35,0.2 ; 7.35,-0.3 7.35,0.2 ; 7.35,0.7 7.35,0.2 ; 7.85,0.2 7.35,0.2 ; -8.15,-0.9 -6.55,-0.9 -6.55,1.3 -8.15,1.3 -8.15,-0.9 ; -5.35,2.6 -5.35,4.4 -4.65,4.4 -4.65,2.6 -5.35,2.6 ; -4.1,2.6 -4.1,4.4 -3.4,4.4 -3.4,2.6 -4.1,2.6 ; -2.85,2.6 -2.85,4.4 -2.15,4.4 -2.15,2.6 -2.85,2.6 ; -1.6,2.6 -1.6,4.4 -0.9,4.4 -0.9,2.6 -1.6,2.6 ; -0.35,2.6 -0.35,4.4 0.35,4.4 0.35,2.6 -0.35,2.6 ; 0.9,2.6 0.9,4.4 1.6,4.4 1.6,2.6 0.9,2.6 ; 2.15,2.6 2.15,4.4 2.85,4.4 2.85,2.6 2.15,2.6 ; 3.4,2.6 3.4,4.4 4.1,4.4 4.1,2.6 3.4,2.6 ; 4.65,2.6 4.65,4.4 5.35,4.4 5.35,2.6 4.65,2.6 ; 6.55,-0.9 8.15,-0.9 8.15,1.3 6.55,1.3 6.55,-0.9
Mechanical 14:
  circle w0.25: c6.125,3.376 r0.125
  lines w0.1: -7.2,-0.7 -7.2,-1.5 -6.45,-1.5 ; -7.2,1.1 -7.2,1.9 -6.45,1.9 ; -6.653,1.1 -7.95,1.1 -7.95,-0.7 -6.65,-0.7 ; -6.45,-1.2 -6.95,-1.2 -6.95,-1 -6.65,-1 -6.65,1.4 -6.95,1.4 -6.95,1.6 -6.45,1.6 ; -5.175,2.5 -5.175,3.725 ; -4.825,2.5 -4.825,3.725 ; -3.925,2.5 -3.925,3.725 ; -3.575,2.5 -3.575,3.725 ; -2.675,2.5 -2.675,3.725 ; -2.325,2.5 -2.325,3.725 ; -1.425,2.5 -1.425,3.725 ; -1.075,2.5 -1.075,3.725 ; -0.175,2.5 -0.175,3.725 ; 0.175,2.5 0.175,3.725 ; 1.075,2.5 1.075,3.725 ; 1.425,2.5 1.425,3.725 ; 2.325,2.5 2.325,3.725 ; 2.675,2.5 2.675,3.725 ; 3.575,2.5 3.575,3.725 ; 3.925,2.5 3.925,3.725 ; 4.825,2.5 4.825,3.725 ; 5.175,2.5 5.175,3.725 ; 6.45,-1.5 7.2,-1.5 7.2,-0.7 ; 6.45,-1.2 6.95,-1.2 6.95,-1 6.65,-1 6.65,1.4 6.95,1.4 6.95,1.6 6.45,1.6 ; 6.45,1.9 7.2,1.9 7.2,1.1 ; 6.65,-0.7 7.95,-0.7 7.95,1.1 6.653,1.1 ; -5.175,3.725 -5.075,4 -4.925,4 -4.825,3.725 ; -5.175,3.725 -4.825,3.725 ; -3.925,3.725 -3.825,4 -3.675,4 -3.575,3.725 ; -3.925,3.725 -3.575,3.725 ; -2.675,3.725 -2.575,4 -2.425,4 -2.325,3.725 ; -2.675,3.725 -2.325,3.725 ; -1.425,3.725 -1.325,4 -1.175,4 -1.075,3.725 ; -1.425,3.725 -1.075,3.725 ; -0.175,3.725 -0.075,4 0.075,4 0.175,3.725 ; -0.175,3.725 0.175,3.725 ; 1.075,3.725 1.175,4 1.325,4 1.425,3.725 ; 1.075,3.725 1.425,3.725 ; 2.325,3.725 2.425,4 2.575,4 2.675,3.725 ; 2.325,3.725 2.675,3.725 ; 3.575,3.725 3.675,4 3.825,4 3.925,3.725 ; 3.575,3.725 3.925,3.725 ; 4.825,3.725 4.925,4 5.075,4 5.175,3.725 ; 4.825,3.725 5.175,3.725 ; -6.45,-2.5 6.45,-2.5 6.45,2.5 -6.45,2.5 -6.45,-2.5
Mechanical 15:
  lines w0.1: -8.4,-1.15 -8.4,1.55 -7.45,1.55 -7.45,2.15 -6.7,2.15 -6.7,2.75 -5.6,2.75 -5.6,4.65 5.6,4.65 5.6,2.75 6.7,2.75 6.7,2.15 7.45,2.15 7.45,1.55 8.4,1.55 8.4,-1.15 7.45,-1.15 7.45,-1.75 6.7,-1.75 6.7,-2.75 -6.7,-2.75 -6.7,-1.75 -7.45,-1.75 -7.45,-1.15 -8.4,-1.15
3D body "HIROSE_DF13-9P-1.25H(21).stp": height 3.6, standoff 0, extent -7.95,-2.5 7.95,4
3D body "p180-070.stp": height 0.02, standoff 0, extent -5.35,2.6 -4.65,4.4
3D body "p180-070.stp": height 0.02, standoff 0, extent -4.1,2.6 -3.4,4.4
3D body "p180-070.stp": height 0.02, standoff 0, extent -2.85,2.6 -2.15,4.4
3D body "p180-070.stp": height 0.02, standoff 0, extent -1.6,2.6 -0.9,4.4
3D body "p180-070.stp": height 0.02, standoff 0, extent -0.35,2.6 0.35,4.4
3D body "p180-070.stp": height 0.02, standoff 0, extent 0.9,2.6 1.6,4.4
3D body "p180-070.stp": height 0.02, standoff 0, extent 2.15,2.6 2.85,4.4
3D body "p180-070.stp": height 0.02, standoff 0, extent 3.4,2.6 4.1,4.4
3D body "p180-070.stp": height 0.02, standoff 0, extent 4.65,2.6 5.35,4.4
3D body "p220-160.stp": height 0.02, standoff 0, extent -8.15,-0.9 -6.55,1.3
3D body "p220-160.stp": height 0.02, standoff 0, extent 6.55,-0.9 8.15,1.3

## HIROSE_FH12-30S-0.5SH(55) [mm] "30 Contacts, Pitch 0.5mm, Bottom Contact Type, Right Angled Surface Mount Connector for FPC/FCC, FH12 Serie"
height 2
pads (32):
  rect 0.3x1.5 smd: 1(-7.25,3.25) 2(-6.75,3.25) 3(-6.25,3.25) 4(-5.75,3.25) 5(-5.25,3.25) 6(-4.75,3.25) 7(-4.25,3.25) 8(-3.75,3.25) 9(-3.25,3.25) 10(-2.75,3.25) 11(-2.25,3.25) 12(-1.75,3.25) 13(-1.25,3.25) 14(-0.75,3.25) 15(-0.25,3.25) 16(0.25,3.25) 17(0.75,3.25) 18(1.25,3.25) 19(1.75,3.25) 20(2.25,3.25) 21(2.75,3.25) 22(3.25,3.25) 23(3.75,3.25) 24(4.25,3.25) 25(4.75,3.25) 26(5.25,3.25) 27(5.75,3.25) 28(6.25,3.25) 29(6.75,3.25) 30(7.25,3.25)
  rect 1.8x2.2 smd: MEC1(-9.15,0) MEC2(9.15,0)
Top Overlay:
  circle w0.25: c-7.975,3.8 r0.125
  lines w0.2: -9.05,-1.4 -9.05,-2 -8.45,-2 ; -9.05,1.4 -9.05,2.6 -7.7,2.6 ; -8.45,-1.4 -8.45,-2.3 -8.85,-2.3 -8.85,-3 8.85,-3 8.85,-2.3 8.45,-2.3 8.45,-1.4 ; -8.2,1.4 -8.2,2.6 ; -7.95,-0.2 -7.45,-0.2 -7.45,0.649 -7.95,0.649 ; -7.828,0.65 -7.828,0.8 -7.375,0.8 -7.375,0.2 7.375,0.2 7.375,0.8 7.673,0.8 7.673,0.65 ; -7.45,0.1 7.45,0.1 ; 7.7,2.6 9.05,2.6 9.05,1.4 ; 7.95,-0.2 7.45,-0.2 7.45,0.65 7.95,0.65 ; 8.2,1.4 8.2,2.6 ; 8.45,-2 9.05,-2 9.05,-1.4
Mechanical 8:
  drawing of 231 lines, arcs and shapes, not listed
Mechanical 14:
  drawing of 218 lines, arcs and shapes, not listed
Mechanical 15:
  lines w0.05: -10.3,-3.25 10.3,-3.25 10.3,4.15 -10.3,4.15 -10.3,-3.25
3D body "p220-180.stp": height 0.02, standoff 0, extent 8.244,-1.1 10.044,1.1
3D body "p220-180.stp": height 0.02, standoff 0, extent -10.044,-1.1 -8.244,1.1
3D body "p150-030.stp": height 0.02, standoff 0, extent 7.1,2.5 7.4,4
3D body "p150-030.stp": height 0.02, standoff 0, extent 6.6,2.5 6.9,4
3D body "p150-030.stp": height 0.02, standoff 0, extent 6.1,2.5 6.4,4
3D body "p150-030.stp": height 0.02, standoff 0, extent 5.6,2.5 5.9,4
3D body "p150-030.stp": height 0.02, standoff 0, extent 5.1,2.5 5.4,4
3D body "p150-030.stp": height 0.02, standoff 0, extent 4.6,2.5 4.9,4
3D body "p150-030.stp": height 0.02, standoff 0, extent 4.1,2.5 4.4,4
3D body "p150-030.stp": height 0.02, standoff 0, extent 3.6,2.5 3.9,4
3D body "p150-030.stp": height 0.02, standoff 0, extent 3.1,2.5 3.4,4
3D body "p150-030.stp": height 0.02, standoff 0, extent 2.6,2.5 2.9,4
3D body "p150-030.stp": height 0.02, standoff 0, extent 2.1,2.5 2.4,4
3D body "p150-030.stp": height 0.02, standoff 0, extent 1.6,2.5 1.9,4
3D body "p150-030.stp": height 0.02, standoff 0, extent 1.1,2.5 1.4,4
3D body "p150-030.stp": height 0.02, standoff 0, extent 0.6,2.5 0.9,4
3D body "p150-030.stp": height 0.02, standoff 0, extent 0.1,2.5 0.4,4
3D body "p150-030.stp": height 0.02, standoff 0, extent -0.4,2.5 -0.1,4
3D body "p150-030.stp": height 0.02, standoff 0, extent -0.9,2.5 -0.6,4
3D body "p150-030.stp": height 0.02, standoff 0, extent -1.4,2.5 -1.1,4
3D body "p150-030.stp": height 0.02, standoff 0, extent -1.9,2.5 -1.6,4
3D body "p150-030.stp": height 0.02, standoff 0, extent -2.4,2.5 -2.1,4
3D body "p150-030.stp": height 0.02, standoff 0, extent -2.9,2.5 -2.6,4
3D body "p150-030.stp": height 0.02, standoff 0, extent -3.4,2.5 -3.1,4
3D body "p150-030.stp": height 0.02, standoff 0, extent -3.9,2.5 -3.6,4
3D body "p150-030.stp": height 0.02, standoff 0, extent -4.4,2.5 -4.1,4
3D body "p150-030.stp": height 0.02, standoff 0, extent -4.9,2.5 -4.6,4
3D body "p150-030.stp": height 0.02, standoff 0, extent -5.4,2.5 -5.1,4
3D body "p150-030.stp": height 0.02, standoff 0, extent -5.9,2.5 -5.6,4
3D body "p150-030.stp": height 0.02, standoff 0, extent -6.4,2.5 -6.1,4
3D body "p150-030.stp": height 0.02, standoff 0, extent -6.9,2.5 -6.6,4
3D body "p150-030.stp": height 0.02, standoff 0, extent -7.4,2.5 -7.1,4
3D body "HIROSE_FH12-30S-0.5SH(55).stp": height 2.05, standoff 0, extent -9.55,-3 9.55,3.4

## HIROSE_FH41-40S-0.5SH(05) [mm] "40 Contacts, 0.5mm Pitch, 2.5mm, Horizontal Mounting, High Speed Transmission Connector for Shielded FFC, FH41 Serie"
height 2.5
pads (50):
  rect 0.3x0.65 smd: 1(9.75,-3.1) 2(9.25,-3.1) 3(8.75,-3.1) 4(8.25,-3.1) 5(7.75,-3.1) 6(7.25,-3.1) 7(6.75,-3.1) 8(6.25,-3.1) 9(5.75,-3.1) 10(5.25,-3.1) 11(4.75,-3.1) 12(4.25,-3.1) 13(3.75,-3.1) 14(3.25,-3.1) 15(2.75,-3.1) 16(2.25,-3.1) 17(1.75,-3.1) 18(1.25,-3.1) 19(0.75,-3.1) 20(0.25,-3.1) 21(-0.25,-3.1) 22(-0.75,-3.1) 23(-1.25,-3.1) 24(-1.75,-3.1) 25(-2.25,-3.1) 26(-2.75,-3.1) 27(-3.25,-3.1) 28(-3.75,-3.1) 29(-4.25,-3.1) 30(-4.75,-3.1) 31(-5.25,-3.1) 32(-5.75,-3.1) 33(-6.25,-3.1) 34(-6.75,-3.1) 35(-7.25,-3.1) 36(-7.75,-3.1) 37(-8.25,-3.1) 38(-8.75,-3.1) 39(-9.25,-3.1) 40(-9.75,-3.1)
  rect 0.4x1.55 smd: 41(11,2.15) 42(-11,2.15)
  rect 0.3x1.2 smd: G1(8.75,2.575) G2(6.25,2.575) G3(3.75,2.575) G4(1.25,2.575) G5(-1.25,2.575) G6(-3.75,2.575) G7(-6.25,2.575) G8(-8.75,2.575)
Top Overlay:
  drawing of 200 lines, arcs and shapes, not listed
Mechanical 8:
  drawing of 304 lines, arcs and shapes, not listed
Mechanical 14:
  drawing of 343 lines, arcs and shapes, not listed
Mechanical 15:
  lines w0.05: -12.25,-3.675 -12.25,3.175 12.25,3.175 12.25,-3.675 -12.25,-3.675
3D body "p150-030.stp": height 0.02, standoff 0, extent -11.163,1.365 -10.863,2.865
3D body "p150-030.stp": height 0.02, standoff 0, extent 10.837,1.365 11.137,2.865
3D body "p150-030.stp": height 0.02, standoff 0, extent 8.587,1.79 8.887,3.29
3D body "p150-030.stp": height 0.02, standoff 0, extent 6.087,1.79 6.387,3.29
3D body "p150-030.stp": height 0.02, standoff 0, extent 3.587,1.79 3.887,3.29
3D body "p150-030.stp": height 0.02, standoff 0, extent 1.087,1.79 1.387,3.29
3D body "p150-030.stp": height 0.02, standoff 0, extent -1.413,1.79 -1.113,3.29
3D body "p150-030.stp": height 0.02, standoff 0, extent -3.913,1.79 -3.613,3.29
3D body "p150-030.stp": height 0.02, standoff 0, extent -6.413,1.79 -6.113,3.29
3D body "p150-030.stp": height 0.02, standoff 0, extent -8.913,1.79 -8.613,3.29
3D body "HIROSE_FH41-40S-0.5SH(05).stp": height 2.5, standoff 0, extent -12,-3.225 12,3.025
3D body "p065-030.stp": height 0.02, standoff 0, extent -9.9,-3.425 -9.6,-2.775
3D body "p065-030.stp": height 0.02, standoff 0, extent -9.4,-3.425 -9.1,-2.775
3D body "p065-030.stp": height 0.02, standoff 0, extent -8.9,-3.425 -8.6,-2.775
3D body "p065-030.stp": height 0.02, standoff 0, extent -8.4,-3.425 -8.1,-2.775
3D body "p065-030.stp": height 0.02, standoff 0, extent -7.9,-3.425 -7.6,-2.775
3D body "p065-030.stp": height 0.02, standoff 0, extent -7.4,-3.425 -7.1,-2.775
3D body "p065-030.stp": height 0.02, standoff 0, extent -6.9,-3.425 -6.6,-2.775
3D body "p065-030.stp": height 0.02, standoff 0, extent -6.4,-3.425 -6.1,-2.775
3D body "p065-030.stp": height 0.02, standoff 0, extent -5.9,-3.425 -5.6,-2.775
3D body "p065-030.stp": height 0.02, standoff 0, extent -5.4,-3.425 -5.1,-2.775
3D body "p065-030.stp": height 0.02, standoff 0, extent -4.9,-3.425 -4.6,-2.775
3D body "p065-030.stp": height 0.02, standoff 0, extent -4.4,-3.425 -4.1,-2.775
3D body "p065-030.stp": height 0.02, standoff 0, extent -3.9,-3.425 -3.6,-2.775
3D body "p065-030.stp": height 0.02, standoff 0, extent -3.4,-3.425 -3.1,-2.775
3D body "p065-030.stp": height 0.02, standoff 0, extent -2.9,-3.425 -2.6,-2.775
3D body "p065-030.stp": height 0.02, standoff 0, extent -2.4,-3.425 -2.1,-2.775
3D body "p065-030.stp": height 0.02, standoff 0, extent -1.9,-3.425 -1.6,-2.775
3D body "p065-030.stp": height 0.02, standoff 0, extent -1.4,-3.425 -1.1,-2.775
3D body "p065-030.stp": height 0.02, standoff 0, extent -0.9,-3.425 -0.6,-2.775
3D body "p065-030.stp": height 0.02, standoff 0, extent -0.4,-3.425 -0.1,-2.775
3D body "p065-030.stp": height 0.02, standoff 0, extent 0.1,-3.425 0.4,-2.775
3D body "p065-030.stp": height 0.02, standoff 0, extent 0.6,-3.425 0.9,-2.775
3D body "p065-030.stp": height 0.02, standoff 0, extent 1.1,-3.425 1.4,-2.775
3D body "p065-030.stp": height 0.02, standoff 0, extent 1.6,-3.425 1.9,-2.775
3D body "p065-030.stp": height 0.02, standoff 0, extent 2.1,-3.425 2.4,-2.775
3D body "p065-030.stp": height 0.02, standoff 0, extent 2.6,-3.425 2.9,-2.775
3D body "p065-030.stp": height 0.02, standoff 0, extent 3.1,-3.425 3.4,-2.775
3D body "p065-030.stp": height 0.02, standoff 0, extent 3.6,-3.425 3.9,-2.775
3D body "p065-030.stp": height 0.02, standoff 0, extent 4.1,-3.425 4.4,-2.775
3D body "p065-030.stp": height 0.02, standoff 0, extent 4.6,-3.425 4.9,-2.775
3D body "p065-030.stp": height 0.02, standoff 0, extent 5.1,-3.425 5.4,-2.775
3D body "p065-030.stp": height 0.02, standoff 0, extent 5.6,-3.425 5.9,-2.775
3D body "p065-030.stp": height 0.02, standoff 0, extent 6.1,-3.425 6.4,-2.775
3D body "p065-030.stp": height 0.02, standoff 0, extent 6.6,-3.425 6.9,-2.775
3D body "p065-030.stp": height 0.02, standoff 0, extent 7.1,-3.425 7.4,-2.775
3D body "p065-030.stp": height 0.02, standoff 0, extent 7.6,-3.425 7.9,-2.775
3D body "p065-030.stp": height 0.02, standoff 0, extent 8.1,-3.425 8.4,-2.775
3D body "p065-030.stp": height 0.02, standoff 0, extent 8.6,-3.425 8.9,-2.775
3D body "p065-030.stp": height 0.02, standoff 0, extent 9.1,-3.425 9.4,-2.775
3D body "p065-030.stp": height 0.02, standoff 0, extent 9.6,-3.425 9.9,-2.775

## HIROSE_FH48-40S-0.5SV [mm] "40 Contacts, 0.5mm Pitch, 2.5mm,Vertical Entry, High Speed Transmission Connector for Shielded FFC"
height 2.5
pads (48):
  rect 0.3x1.63 smd: 1(9.75,-1.785) 2(9.25,-1.785) 3(8.75,-1.785) 4(8.25,-1.785) 5(7.75,-1.785) 6(7.25,-1.785) 7(6.75,-1.785) 8(6.25,-1.785) 9(5.75,-1.785) 10(5.25,-1.785) 11(4.75,-1.785) 12(4.25,-1.785) 13(3.75,-1.785) 14(3.25,-1.785) 15(2.75,-1.785) 16(2.25,-1.785) 17(1.75,-1.785) 18(1.25,-1.785) 19(0.75,-1.785) 20(0.25,-1.785) 21(-0.25,-1.785) 22(-0.75,-1.785) 23(-1.25,-1.785) 24(-1.75,-1.785) 25(-2.25,-1.785) 26(-2.75,-1.785) 27(-3.25,-1.785) 28(-3.75,-1.785) 29(-4.25,-1.785) 30(-4.75,-1.785) 31(-5.25,-1.785) 32(-5.75,-1.785) 33(-6.25,-1.785) 34(-6.75,-1.785) 35(-7.25,-1.785) 36(-7.75,-1.785) 37(-8.25,-1.785) 38(-8.75,-1.785) 39(-9.25,-1.785) 40(-9.75,-1.785)
  rect 0.3x1.2 smd: G1(8.75,2) G2(6.25,2) G3(3.75,2) G4(1.25,2) G5(-1.25,2) G6(-3.75,2) G7(-6.25,2) G8(-8.75,2)
Top Overlay:
  circle w0.25: c11.927,-4.086 r0.125
  lines w0.2: -11.275,-1.72 -11.275,-4.37 -10.185,-4.37 ; -10.935,-0.3 -10.485,-0.3 -10.285,-0.1 -10.285,0.95 ; -10.935,0.384 -10.285,0.384 ; -10.385,-0.2 10.398,-0.2 ; -10.285,0.22 10.285,0.22 ; -10.285,0.52 10.285,0.52 ; -10.185,-3.92 -5.185,-3.92 ; -10.185,-2.9 -10.185,-4.37 ; -10.185,-0.67 -10.185,-0.2 ; -9.25,1.53 -11.535,1.53 -11.535,0.58 -12.5,0.58 -12.5,-1.72 -10.935,-1.72 -10.935,0.95 10.935,0.95 10.935,-1.72 12.5,-1.72 12.5,0.58 11.535,0.58 11.535,1.53 9.25,1.53 ; -8.25,1.53 -6.75,1.53 ; -5.75,1.53 -4.25,1.53 ; -3.25,1.53 -1.75,1.53 ; -0.75,1.53 0.75,1.53 ; 1.75,1.53 3.25,1.53 ; 4.25,1.53 5.75,1.53 ; 6.75,1.53 8.25,1.53 ; 10.185,-3.92 5.185,-3.92 ; 10.185,-2.9 10.185,-4.37 ; 10.185,-0.67 10.185,-0.2 ; 10.285,0.384 10.935,0.384 ; 10.285,0.95 10.285,-0.1 10.485,-0.3 10.935,-0.3 ; 11.275,-1.72 11.275,-4.37 10.185,-4.37 ; -10.185,-4.37 -10.185,-4.42 -5.185,-4.42 -5.185,-3.92 ; -5.185,-3.92 5.185,-3.92 ; 5.185,-3.92 5.185,-4.42 10.185,-4.42 10.185,-4.37
Mechanical 8:
  drawing of 292 lines, arcs and shapes, not listed
Mechanical 14:
  circle w0.25: c11.927,-4.086 r0.125
  lines w0.1: -11.275,-1.72 -11.275,-4.37 -10.185,-4.37 ; -10.935,-0.3 -10.485,-0.3 -10.285,-0.1 -10.285,0.95 ; -10.935,0.384 -10.285,0.384 ; -10.385,-0.2 10.398,-0.2 ; -10.285,0.22 10.285,0.22 ; -10.285,0.52 10.285,0.52 ; -10.185,-3.92 -5.185,-3.92 ; -10.185,-0.2 -10.185,-4.37 ; -8.81,2.05 -8.81,2.35 -8.69,2.35 -8.69,2.05 ; -6.31,2.05 -6.31,2.35 -6.19,2.35 -6.19,2.05 ; -3.81,2.05 -3.81,2.35 -3.69,2.35 -3.69,2.05 ; -1.31,2.05 -1.31,2.35 -1.19,2.35 -1.19,2.05 ; 1.19,2.05 1.19,2.35 1.31,2.35 1.31,2.05 ; 3.69,2.05 3.69,2.35 3.81,2.35 3.81,2.05 ; 6.19,2.05 6.19,2.35 6.31,2.35 6.31,2.05 ; 8.69,2.05 8.69,2.35 8.81,2.35 8.81,2.05 ; 10.185,-3.92 5.185,-3.92 ; 10.185,-0.2 10.185,-4.37 ; 10.285,0.384 10.935,0.384 ; 10.285,0.95 10.285,-0.1 10.485,-0.3 10.935,-0.3 ; 11.275,-1.72 11.275,-4.37 10.185,-4.37 ; -10.185,-4.37 -10.185,-4.42 -5.185,-4.42 -5.185,-3.92 ; -5.185,-3.92 5.185,-3.92 ; 5.185,-3.92 5.185,-4.42 10.185,-4.42 10.185,-4.37 ; -12.5,-1.72 -12.5,0.58 -11.535,0.58 -11.535,1.53 -9.25,1.53 -9.25,2.05 -8.25,2.05 -8.25,1.53 -6.75,1.53 -6.75,2.05 -5.75,2.05 -5.75,1.53 -4.25,1.53 -4.25,2.05 -3.25,2.05 -3.25,1.53 -1.75,1.53 -1.75,2.05 -0.75,2.05 -0.75,1.53 0.75,1.53 0.75,2.05 1.75,2.05 1.75,1.53 3.25,1.53 3.25,2.05 4.25,2.05 4.25,1.53 5.75,1.53 5.75,2.05 6.75,2.05 6.75,1.53 8.25,1.53 8.25,2.05 9.25,2.05 9.25,1.53 11.535,1.53 11.535,0.58 12.5,0.58 12.5,-1.72 10.935,-1.72 10.935,0.95 -10.935,0.95 -10.935,-1.72 -12.5,-1.72
Mechanical 15:
  lines w0.05: -12.75,-4.67 12.75,-4.67 12.75,2.85 -12.75,2.85 -12.75,-4.67
3D body "p150-030.stp": height 0.02, standoff 0, extent 8.587,1.215 8.887,2.715
3D body "p150-030.stp": height 0.02, standoff 0, extent 6.087,1.215 6.387,2.715
3D body "p150-030.stp": height 0.02, standoff 0, extent 3.587,1.215 3.887,2.715
3D body "p150-030.stp": height 0.02, standoff 0, extent 1.087,1.215 1.387,2.715
3D body "p150-030.stp": height 0.02, standoff 0, extent -1.413,1.215 -1.113,2.715
3D body "p150-030.stp": height 0.02, standoff 0, extent -3.913,1.215 -3.613,2.715
3D body "p150-030.stp": height 0.02, standoff 0, extent -6.413,1.215 -6.113,2.715
3D body "p150-030.stp": height 0.02, standoff 0, extent -8.913,1.215 -8.613,2.715
3D body "HIROSE_FH48-40S-0.5SV.stp": height 6.18, standoff 0, extent -12.5,-4.42 12.5,2.35